# Altium footprint library cool_library.PcbLib: 1182 footprints (part 43 of 75)
Each footprint in its own frame and in the unit in brackets; x right, y up, seen from the top. Pads: shape width x height; smd on the part's side, far side on the other; paste and mask are expansions set on the pad; w line width, h text height; cw(c..) or ccw(c..) is an arc to the next point about the centre after c.
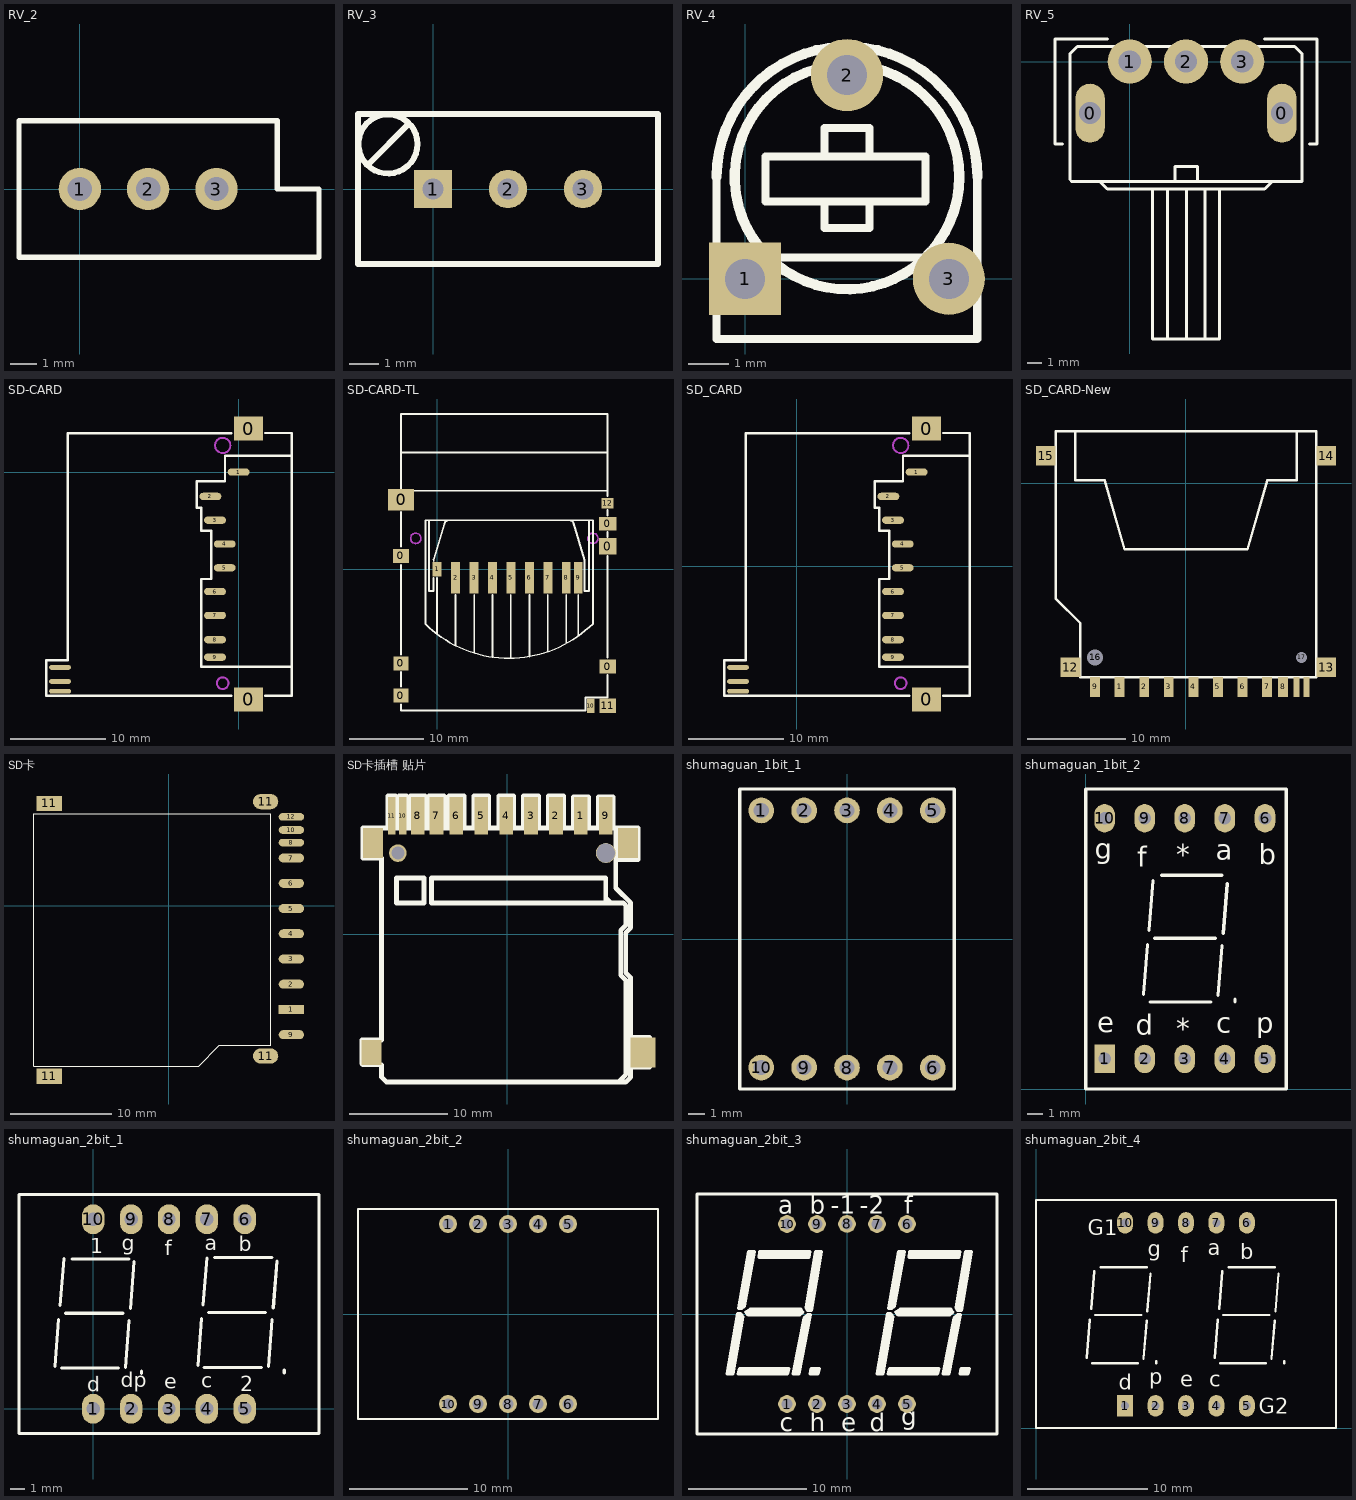
[diagram p42: the footprints below, top view; thin cyan lines are the x and y axes]

## RV_2 [mil]
pads (3):
  round 62 hole 35.43: 1(0,0) 2(100,0) 3(200,0)
Top Overlay:
  lines w8: -88.98,-100 -88.98,100 288.98,100 288.98,0 350,0 350,-100 -88.98,-100

## RV_3 [mm]
pads (3):
  rect 1.3x1.3 hole 0.711: 1(0,0)
  round 1.3 hole 0.711: 2(2.54,0) 3(5.08,0)
Top Overlay:
  circle w0.2: c-1.524,1.524 r1
  lines w0.203: -2.151,0.876 -0.874,2.153 ; -2.54,-2.54 -2.54,0 -2.54,2.54 7.62,2.54 7.62,-2.54 -2.54,-2.54

## RV_4 [mm]
pads (3):
  rect 1.8x1.8 hole 1: 1(0,0)
  round 1.8 hole 1: 2(2.54,5.08) 3(5.08,0)
Top Overlay:
  circle w0.254: c2.54,2.54 r2.801
  lines w0.203: -0.711,-1.5 5.789,-1.5 5.789,2.539 ; -0.71,-1.499 -0.71,2.54 ; 0.61,0.533 4.572,0.533 ; 1.981,1.93 1.981,1.27 3.099,1.27 3.099,1.93 ; 1.981,3.099 1.981,3.759 3.099,3.759 3.099,3.099 ; 0.508,1.93 0.508,3.048 4.496,3.048 4.496,1.93 0.508,1.93
  lines w0.254: -0.71,2.54 cw(c2.54,2.54) 5.79,2.54

## RV_5 [mm]
pads (5):
  oval 2x4 hole 1.5: 0(-2.69,-3.5) 0(10.31,-3.5)
  round 3 hole 1.5: 1(0,0) 2(3.81,0) 3(7.62,0)
Top Overlay:
  lines w0.203: -4.572,-5.588 -5.08,-5.588 -5.08,1.524 -2.54,1.524 ; -4.572,1.524 -1.524,1.524 ; -4.064,-8 -4.064,0.508 -3.556,1.016 11.176,1.016 11.684,0.508 11.684,-8.128 -3.936,-8.128 ; -2.032,-8.128 -1.524,-8.636 9.144,-8.636 9.652,-8.128 ; 1.524,-8.636 1.524,-18.796 6.096,-18.796 6.096,-8.636 ; 2.54,-18.796 2.54,-8.636 ; 3.048,-8.128 3.048,-7.112 4.572,-7.112 4.572,-8.128 ; 3.85,-18.796 3.85,-8.636 ; 5.08,-18.796 5.08,-8.636 ; 9.144,1.524 12.7,1.524 12.7,-5.588 12.192,-5.588
Keep-Out Layer:
  lines w1.5: -2.692,-4.521 -2.692,-2.489 ; 10.308,-4.521 10.308,-2.489

## SD-CARD [mil]
pads (14):
  rect 120x98 smd: 0(40.8,-935.91) 0(40.8,179.09)
  oval 90x30 smd: 1(0,0) 2(-116,-100) 3(-97,-198) 4(-57,-296) 5(-57,-394) 6(-97,-492) 7(-97,-590) 8(-97,-690) 9(-97,-762)
  oval 90x19.68 smd: 10(-734.79,-804) 11(-734.79,-862) 12(-734.79,-902)
Top Overlay:
  lines w10: -703.04,-920.16 -30,-920.16 ; -703.04,-774.17 -790.98,-774.17 -790.98,-920.17 -682.98,-920.17 ; -703.04,-773.17 -703.04,159.83 -30,159.84 ; 110,-920.16 217.96,-920.16 217.96,160.83 110,160.84 ; 216.96,66.83 -56.04,66.83 -56.04,-38.17 -173.04,-38.17 -173.04,-146.17 -154.04,-146.17 -154.04,-242.17 -112.04,-242.17 -112.04,-440.17 -153.04,-440.17 -153.04,-802.17 217.96,-802.17
Keep-Out Layer:
  circle w8: c-65.5,109.65 r31.5
  circle w8: c-65.5,-868.98 r24
Mechanical 1:
  circle w8: c-65.5,-868.98 r24
  circle w8: c-65.5,109.65 r31.5

## SD-CARD-TL [mm]
pads (19):
  rect 2x1.9 smd: 0(-4.911,-17.105) 0(-4.911,-12.761)
  rect 2.2x1.9 smd: 0(-4.911,1.818) 0(23.105,-13.193)
  rect 3.5x2.9 smd: 0(-4.886,9.44)
  rect 2.4x1.8 smd: 0(23.105,6.187)
  rect 2.4x2.2 smd: 0(23.13,3.114)
  rect 1.2x2 smd: 1(0,0)
  rect 1.2x4.3 smd: 2(2.5,-1.15) 3(5,-1.15) 4(7.5,-1.15) 5(10,-1.15) 6(12.5,-1.15) 7(15,-1.15) 8(17.5,-1.15) 9(19.125,-1.15)
  rect 1x1.95 smd: 10(20.821,-18.51)
  rect 2.2x1.95 smd: 11(23.13,-18.51)
  rect 1.6x1.4 smd: 12(23.105,8.93)
Top Overlay:
  lines w0.203: -1.6,-7.408 ccw(c9.73,4.047) 21.121,-7.348
  lines w0.254: -4.9,-18.311 -4.9,-19.16 20.094,-19.16 ; -4.9,-15.875 -4.9,-13.919 ; -4.9,-11.557 -4.9,0.584 ; -4.9,3.099 -4.9,7.747 ; -4.9,11.201 -4.9,21.04 ; -1.6,-7.408 -1.6,-2.39 -1.6,6.64 21.11,6.64 21.11,-2.36 21.11,-7.36 ; -1.085,6.64 -1.085,-2.96 -0.466,-2.96 -0.466,-1.174 ; -0.463,1.137 -0.463,1.34 -0.466,1.34 -0.463,1.344 1.032,6.271 ; 0.007,-8.769 0.007,-1.174 ; 1.015,6.14 cw(c1.515,6.14) 1.515,6.64 ; 2.491,-10.346 2.491,-3.46 ; 5.031,-11.337 5.031,-3.46 ; 7.495,-11.896 7.495,-3.46 ; 9.984,-12.023 9.984,-3.46 ; 12.499,-11.794 12.499,-3.46 ; 14.988,-11.134 14.988,-3.46 ; 17.385,6.64 18.108,6.64 ; 17.503,-10.016 17.503,-3.46 ; 17.995,6.64 cw(c17.995,6.14) 18.495,6.14 ; 18.477,6.271 19.976,1.267 19.976,-2.96 20.585,-2.96 20.585,6.64 ; 19.128,-9 19.128,-3.46 ; 20.1,-19.154 20.1,-17.36 23.1,-17.36 23.1,-14.3 ; 23.1,-11.963 23.1,1.829 ; 23.1,4.394 23.1,5.08 ; 23.1,7.264 23.1,8.026 ; 23.1,9.917 23.1,10.64 ; -4.9,15.84 -4.9,21.04 ; -4.9,15.84 -4.9,10.64 23.1,10.64 ; -4.9,15.84 23.1,15.84 ; -4.9,21.04 23.1,21.04 23.1,15.84 ; 23.1,10.64 23.1,15.84
Keep-Out Layer:
  circle w0.203: c21.1,4.19 r0.7
  circle w0.203: c-2.9,4.19 r0.7
Mechanical 1:
  circle w0.203: c-2.9,4.19 r0.7
  circle w0.203: c21.1,4.19 r0.7

## SD_CARD [mil]
pads (14):
  rect 120x98 smd: 0(533.79,-548.91) 0(533.79,566.09)
  oval 90x30 smd: 1(493,387) 2(377,287) 3(396,189) 4(436,91) 5(436,-7) 6(396,-105) 7(396,-203) 8(396,-303) 9(396,-375)
  oval 90x19.68 smd: 10(-241.79,-417) 11(-241.79,-475) 12(-241.79,-515)
Top Overlay:
  lines w10: -210.04,-533.16 463,-533.16 ; -210.04,-387.17 -297.98,-387.17 -297.98,-533.17 -189.98,-533.17 ; -210.04,-386.17 -210.04,546.83 463,546.84 ; 603,-533.16 710.96,-533.16 710.96,547.83 603,547.84 ; 709.96,453.83 436.96,453.83 436.96,348.83 319.96,348.83 319.96,240.83 338.96,240.83 338.96,144.83 380.96,144.83 380.96,-53.17 339.96,-53.17 339.96,-415.17 710.96,-415.17
Keep-Out Layer:
  circle w8: c427.5,496.65 r31.5
  circle w8: c427.5,-481.98 r24
Mechanical 1:
  circle w8: c427.5,-481.98 r24
  circle w8: c427.5,496.65 r31.5

## SD_CARD-New [mm]
pads (17):
  rect 1x2 smd: 1(-6.719,-20.684) 2(-4.219,-20.684) 3(-1.719,-20.684) 4(0.781,-20.684) 5(3.281,-20.684) 6(5.781,-20.684) 7(8.281,-20.684) 8(9.906,-20.684) 9(-9.219,-20.684)
  rect 0.6x2 smd: 10(12.281,-20.684) 11(11.281,-20.684)
  rect 2x2 smd: 12(-11.719,-18.684) 13(14.281,-18.684) 14(14.281,2.816) 15(-14.219,2.816)
  round 1.5 hole 1.6: 16(-9.219,-17.684)
  round 1 hole 1.1: 17(11.781,-17.684)
Top Overlay:
  lines w0.254: -11.219,5.316 -11.219,0.316 -8.219,0.316 -6.219,-6.684 6.281,-6.684 8.281,0.316 11.281,0.316 11.281,5.316 ; -13.219,-11.684 -13.219,5.316 13.281,5.316 13.281,-19.684 -10.719,-19.684 -10.719,-14.184 -13.219,-11.684

## SD卡 [mil]
pads (15):
  rect 98.42x35 smd: 1(475.58,-402)
  oval 98.42x35 smd: 2(475.58,-304) 3(475.58,-206) 4(475.58,-108) 5(475.58,-10) 6(475.58,88) 7(475.58,186) 9(475.58,-500)
  oval 98.43x30 smd: 8(475.57,246) 10(475.57,295) 12(475.57,346)
  rect 98.42x59.05 smd: 11(-464.42,-662) 11(-464.42,398)
  oval 98.42x59.05 smd: 11(375.58,-583.1) 11(375.58,405.09)
Top Overlay:
  lines w4: -424.42,-622 115.58,-622 195.58,-542 395.58,-542 ; -424.42,358 395.58,358 395.58,-542 ; -404.42,358 -524.42,358 -524.42,-622 -304.42,-622 ; 255.58,-542 395.58,-542

## SD卡插槽 贴片 [mil]
pads (17):
  rect 55x150 smd: 1(295.19,475.42) 2(195.19,475.42) 3(95.19,475.42) 4(-4.81,475.42) 5(-104.81,475.42) 6(-204.81,475.42) 7(-284.81,475.42) 8(-359.81,475.42) 9(395.19,475.42)
  rect 30x150 smd: 10(-419.81,475.42) 11(-464.81,475.42)
  rect 80x100 smd: ""(-544.81,-474.58)
  rect 80x120 smd: ""(-539.81,365.42) ""(485.19,365.42)
  round 70.87 hole 52: ""(-439.81,325.42)
  round 80 hole 75: ""(395.19,325.42)
  rect 100x120 smd: ""(544.81,-475.42)
Top Overlay:
  lines w19.68: -479.81,425.42 -479.81,555.42 -449.81,555.42 -449.81,425.42 -504.81,425.42 -579.81,425.42 -579.81,305.42 -504.81,305.42 -504.81,-424.58 -584.81,-424.58 -584.81,-519.58 -579.81,-524.58 -504.81,-524.58 -504.81,-574.58 -484.81,-594.58 -474.81,-594.58 475.19,-594.58 495.19,-574.58 495.19,-174.58 475.19,-154.58 475.19,5.42 495.19,25.42 495.19,35.42 495.19,105.42 495.19,125.42 435.19,185.42 435.19,415.42 435.19,425.42 ; -454.81,425.42 435.19,425.42 ; -434.81,425.42 -434.81,555.42 -404.81,555.42 -404.81,425.42 ; -389.81,430.42 -389.81,555.42 -329.81,555.42 -329.81,430.42 ; -354.81,125.42 -334.81,125.42 -334.81,225.42 -444.81,225.42 -444.81,125.42 -344.81,125.42 ; -314.81,430.42 -314.81,555.42 -254.81,555.42 -254.81,430.42 ; -234.81,430.42 -234.81,555.42 -174.81,555.42 -174.81,430.42 ; -134.81,430.42 -134.81,555.42 -74.81,555.42 -74.81,430.42 ; -34.81,430.42 -34.81,555.42 25.19,555.42 25.19,430.42 ; 65.19,430.42 65.19,555.42 125.19,555.42 125.19,430.42 ; 165.19,430.42 165.19,555.42 225.19,555.42 225.19,430.42 ; 265.19,425.42 265.19,550.42 325.19,550.42 325.19,425.42 ; 365.19,425.42 365.19,550.42 425.19,550.42 425.19,425.42 ; 395.19,145.42 415.19,125.42 ; 435.19,300.42 525.19,300.42 525.19,425.42 435.19,425.42 ; 445.19,-594.58 475.19,-564.58 475.19,-194.58 475.19,-184.58 455.19,-164.58 455.19,15.42 475.19,35.42 475.19,115.42 465.19,125.42 395.19,125.42 ; 495.19,-534.58 570.19,-534.58 ; 495.19,-414.58 570.19,-414.58 ; 395.19,125.42 395.19,135.42 395.19,225.42 -304.81,225.42 -304.81,125.42 395.19,125.42

## shumaguan_1bit_1 [mil]
pads (10):
  round 60 hole 35.43: 1(-200,300) 2(-100,300) 3(0,300) 4(100,300) 5(200,300) 6(200,-300) 7(100,-300) 8(0,-300) 9(-100,-300) 10(-200,-300)
Top Overlay:
  lines w8: -250,-350 -250,350 250,350 250,-350 -250,-350

## shumaguan_1bit_2 [mm]
pads (10):
  rect 1.3x1.8 hole 0.8: 1(1.194,1.905)
  oval 1.3x1.8 hole 0.8: 2(3.734,1.905) 3(6.274,1.905) 4(8.814,1.905) 5(11.354,1.905) 6(11.354,17.145) 7(8.814,17.145) 8(6.274,17.145) 9(3.734,17.145) 10(1.194,17.145)
Top Overlay:
  lines w0.203: 3.658,5.994 3.912,9.144 ; 4.013,10.058 4.267,13.208 ; 4.089,5.512 7.925,5.512 ; 4.369,9.55 8.204,9.55 ; 4.801,13.538 8.636,13.538 ; 8.382,5.918 8.636,9.068 ; 8.712,9.855 8.966,13.005 ; 9.449,5.512 9.449,5.69 ; 0,0 12.7,0 12.7,19 0,19 0,0
  text "*" at 5.74,14.249 h1.27
  text "*" at 5.74,3.226 h1.27
  text "a" at 8.23,14.503 h1.27
  text "b" at 10.947,14.224 h1.27
  text "p" at 10.795,3.556 h1.27
  text "c" at 8.28,3.556 h1.27
  text "d" at 3.175,3.429 h1.27
  text "e" at 0.737,3.607 h1.27
  text "f" at 3.277,14.072 h1.27
  text "g" at 0.584,14.58 h1.27

## shumaguan_2bit_1 [mm]
pads (10):
  oval 1.5x2 hole 0.9: 1(0,0) 2(2.54,0) 3(5.08,0) 4(7.62,0) 5(10.16,0) 6(10.16,12.7) 7(7.62,12.7) 8(5.08,12.7) 9(2.54,12.7) 10(0,12.7)
Top Overlay:
  lines w0.203: -2.565,2.845 -2.311,5.994 ; -2.21,6.909 -1.956,10.058 ; -2.134,2.718 1.702,2.718 ; -1.854,6.401 1.981,6.401 ; -1.422,10.033 2.413,10.033 ; 2.159,2.769 2.413,5.918 ; 2.489,6.706 2.743,9.855 ; 3.226,2.362 3.226,2.54 ; 7.01,2.896 7.264,6.045 ; 7.366,6.96 7.62,10.109 ; 7.442,2.769 11.278,2.769 ; 7.722,6.452 11.557,6.452 ; 8.128,10.135 11.963,10.135 ; 11.735,2.819 11.989,5.969 ; 12.065,6.756 12.319,9.906 ; 12.802,2.413 12.802,2.591 ; -4.97,-1.65 -4.97,14.35 15.13,14.35 15.13,-1.65 -4.97,-1.65
  text "f" at 4.801,10.287 h1
  text "a" at 7.468,10.617 h1
  text "b" at 9.754,10.541 h1
  text "g" at 1.905,10.617 h1
  text "2" at 9.855,1.168 h1
  text "1" at -0.203,10.414 h1
  text "e" at 4.75,1.346 h1
  text "c" at 7.239,1.397 h1
  text "dp" at 1.854,1.448 h1
  text "d" at -0.395,1.144 h1

## shumaguan_2bit_2 [mil]
pads (10):
  round 60 hole 35.43: 1(-200,300) 2(-100,300) 3(0,300) 4(100,300) 5(200,300) 6(200,-300) 7(100,-300) 8(0,-300) 9(-100,-300) 10(-200,-300)
Top Overlay:
  lines w8: -500,-350 -500,350 500,350 500,-350 -500,-350

## shumaguan_2bit_3 [mm]
pads (10):
  round 1.5 hole 0.9: 1(-5.08,-7.62) 2(-2.54,-7.62) 3(0,-7.62) 4(2.54,-7.62) 5(5.08,-7.62) 6(5.08,7.62) 7(2.54,7.62) 8(0,7.625) 9(-2.54,7.62) 10(-5.08,7.62)
Top Overlay:
  lines w0.254: -9.906,-5.08 -9.017,0.051 ; -9.169,-4.851 -4.97,-4.846 ; -8.103,5.283 -8.945,0.454 ; -7.42,5.054 -3.17,5.054 ; -4.32,-5.071 -3.345,-0.046 ; -3.277,0.305 -2.413,5.309 ; -3.095,-4.846 -2.413,-4.851 ; 2.794,-5.08 3.683,0.051 ; 3.531,-4.851 7.73,-4.846 ; 4.597,5.283 3.755,0.454 ; 5.28,5.054 9.53,5.054 ; 8.38,-5.071 9.355,-0.046 ; 9.423,0.305 10.287,5.309 ; 9.605,-4.846 10.287,-4.851 ; -9.017,0.051 -9.27,0.054 -10.16,-5.08 -9.652,-5.08 -8.82,-0.221 -9.017,0.051 ; -8.945,0.454 -9.195,0.454 -8.357,5.309 -7.849,5.309 -8.67,0.654 -8.945,0.454 ; -8.585,0.152 -8.395,-0.096 -4.028,-0.096 -3.745,0.154 ; -8.585,0.152 -3.745,0.154 ; -8.585,0.152 -8.23,0.406 -3.895,0.404 -3.745,0.154 ; -3.345,-0.046 -3.645,-0.321 -4.57,-5.096 -4.07,-5.096 -3.095,-0.046 -3.345,-0.046 ; 3.683,0.051 3.43,0.054 2.54,-5.08 3.048,-5.08 3.88,-0.221 3.683,0.051 ; 3.755,0.454 3.505,0.454 4.343,5.309 4.851,5.309 4.03,0.654 3.755,0.454 ; 4.115,0.152 4.305,-0.096 8.672,-0.096 8.955,0.154 ; 4.115,0.152 8.955,0.154 ; 4.115,0.152 4.47,0.406 8.805,0.404 8.955,0.154 ; 9.355,-0.046 9.055,-0.321 8.13,-5.096 8.63,-5.096 9.605,-0.046 9.355,-0.046 ; -12.7,-10.16 -12.7,10.16 12.7,10.16 12.7,-10.16 -12.7,-10.16 ; -9.219,-5.096 -5.02,-5.096 -4.92,-4.596 -9.119,-4.597 -9.219,-5.096 ; -7.47,4.804 -3.22,4.804 -3.12,5.304 -7.395,5.304 -7.47,4.804 ; -3.48,0.533 -2.667,5.309 -2.159,5.309 -3.023,0.305 -3.353,0.305 -3.48,0.533 ; -3.145,-5.096 -2.445,-5.096 -2.345,-4.596 -3.045,-4.596 -3.145,-5.096 ; 3.481,-5.096 7.68,-5.096 7.78,-4.596 3.581,-4.597 3.481,-5.096 ; 5.23,4.804 9.48,4.804 9.58,5.304 5.305,5.304 5.23,4.804 ; 9.22,0.533 10.033,5.309 10.541,5.309 9.677,0.305 9.347,0.305 9.22,0.533 ; 9.555,-5.096 10.255,-5.096 10.355,-4.596 9.655,-4.596 9.555,-5.096
  text "a" at -5.842,8.509 h1.52
  text "b" at -3.175,8.509 h1.52
  text "-1" at -1.397,8.509 h1.52
  text "-2" at 1.092,8.509 h1.52
  text "f" at 4.826,8.509 h1.52
  text "c" at -5.715,-9.906 h1.52
  text "h" at -3.175,-9.906 h1.52
  text "e" at -0.508,-9.906 h1.52
  text "d" at 1.905,-9.906 h1.52
  text "g" at 4.572,-9.398 h1.52

## shumaguan_2bit_4 [mm]
pads (10):
  rect 1.3x1.8 hole 0.7: 1(7.42,1.848)
  oval 1.3x1.8 hole 0.7: 2(9.96,1.848) 3(12.5,1.848) 4(15.04,1.848) 5(17.58,1.848) 6(17.58,17.088) 7(15.04,17.088) 8(12.5,17.088) 9(9.96,17.088) 10(7.42,17.088)
Top Overlay:
  lines w0.203: 4.234,5.862 4.488,9.012 ; 4.589,9.926 4.843,13.076 ; 4.665,5.38 8.501,5.38 ; 4.945,9.418 8.78,9.418 ; 5.377,13.406 9.212,13.406 ; 8.958,5.786 9.212,8.936 ; 9.288,9.723 9.542,12.873 ; 10.025,5.38 10.025,5.558 ; 14.902,5.862 15.156,9.012 ; 15.257,9.926 15.511,13.076 ; 15.333,5.38 19.169,5.38 ; 15.613,9.418 19.448,9.418 ; 16.045,13.406 19.88,13.406 ; 19.626,5.786 19.88,8.936 ; 19.956,9.723 20.21,12.873 ; 20.693,5.38 20.693,5.558 ; 0,0 25,0 25,19 0,19 0,0
  text "c" at 14.453,3.429 h1.27
  text "e" at 12.014,3.454 h1.27
  text "p" at 9.423,3.658 h1.27
  text "d" at 6.883,3.2 h1.27
  text "b" at 17.018,14.046 h1.27
  text "a" at 14.326,14.402 h1.27
  text "f" at 12.065,13.792 h1.27
  text "g" at 9.322,14.3 h1.27
  text "G2" at 18.567,1.168 h1.27
  text "G1" at 4.293,16.078 h1.27